# Altium footprint library hallglib.PcbLib: 106 footprints (part 2 of 7)
Each footprint in its own frame and in the unit in brackets; x right, y up, seen from the top. Pads: shape width x height; smd on the part's side, far side on the other; paste and mask are expansions set on the pad; w line width, h text height; cw(c..) or ccw(c..) is an arc to the next point about the centre after c.
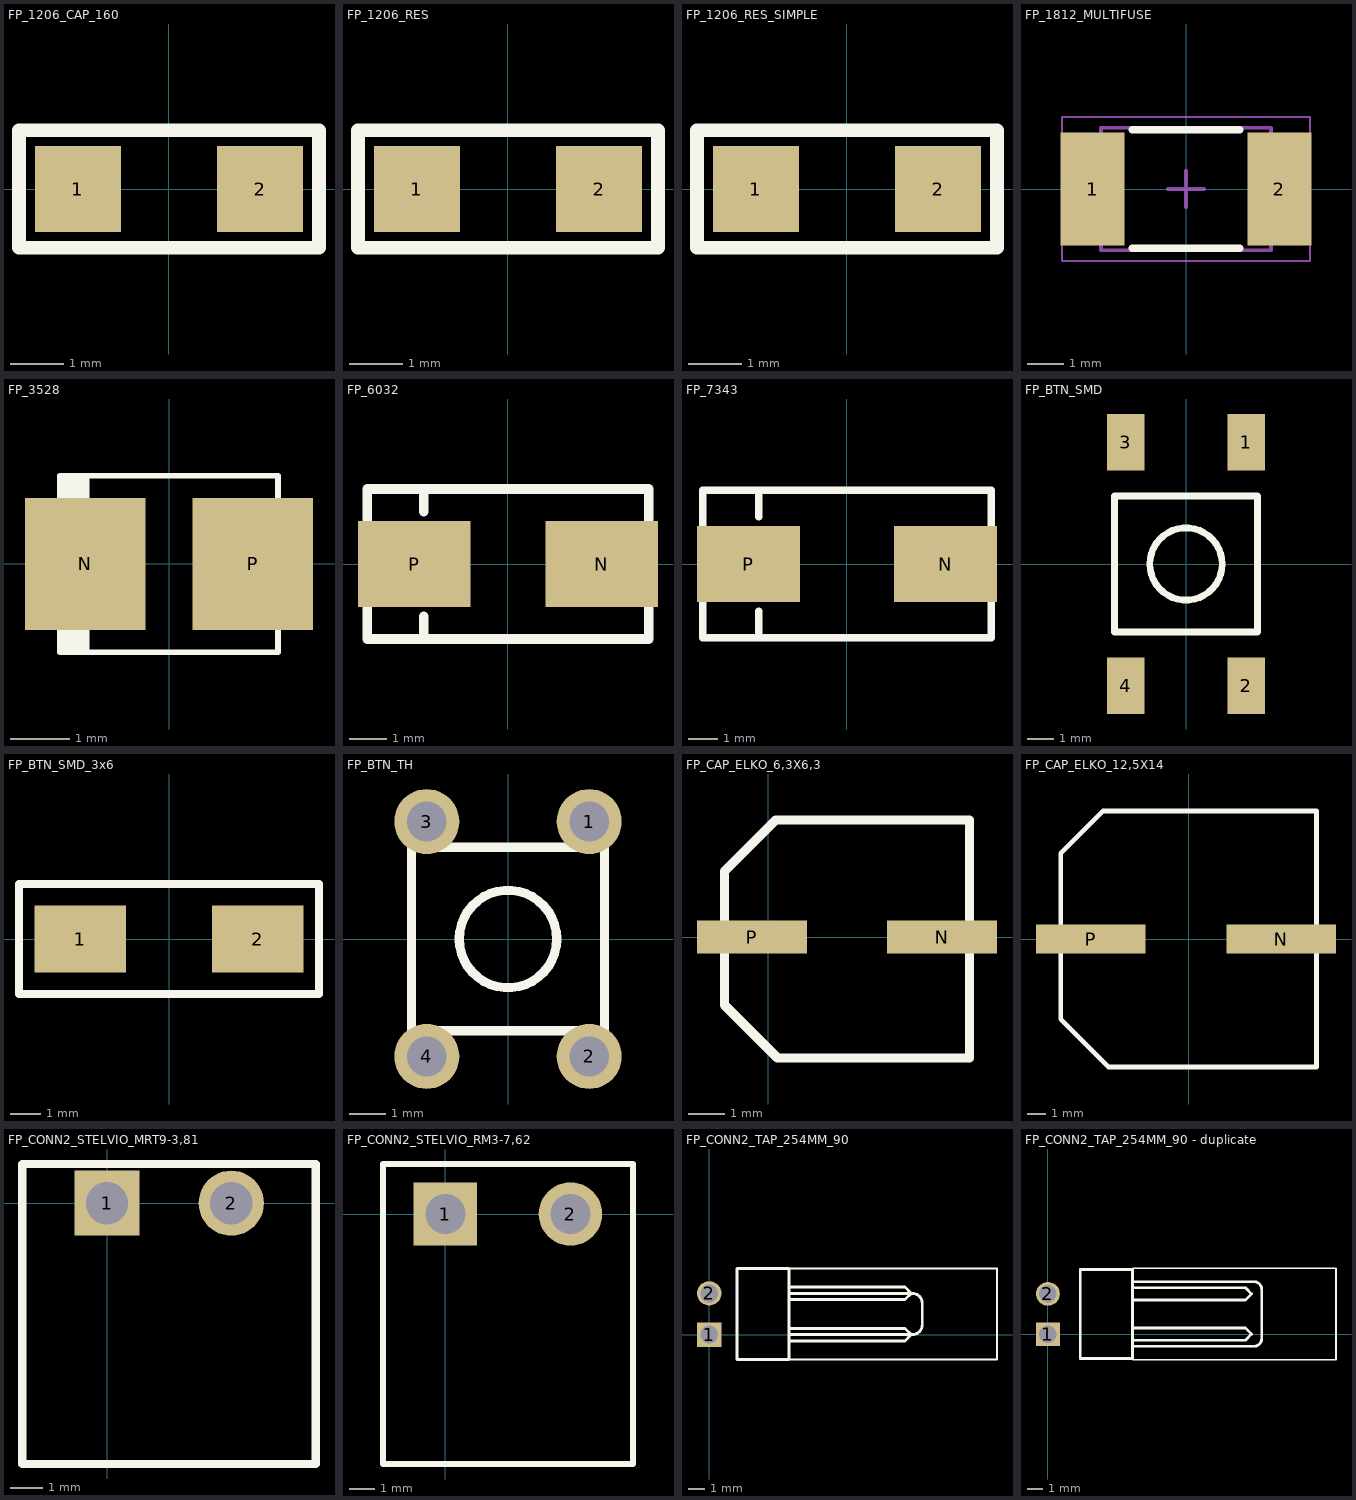
[diagram p1: the footprints below, top view; thin cyan lines are the x and y axes]

## FP_1206_CAP_160 [mm] "1206 kapacitás 1.6mm magas"
height 1.62
pads (2):
  rect 1.6x1.6 smd: 1(-1.7,0) 2(1.7,0)
Top Overlay:
  lines w0.254: -2.8,-1.1 2.8,-1.1 2.8,1.1 -2.8,1.1 -2.8,-1.1
3D body: height 1.6, standoff 0, extent -1.065,-0.787 1.119,0.787
3D body: height 1.6, standoff 0, extent 1.119,-0.787 1.577,0.787
3D body: height 1.6, standoff 0, extent -1.522,-0.787 -1.065,0.787

## FP_1206_RES [mm] "1206 ellenállás"
height 0.5
pads (2):
  rect 1.6x1.6 smd: 1(-1.7,0) 2(1.7,0)
Top Overlay:
  lines w0.254: -2.8,-1.1 -2.8,1.1 2.8,1.1 2.8,-1.1 -2.8,-1.1
3D body "1206RES.STEP": height 0.62, standoff 0.02, extent -1.6,-0.8 1.6,0.8

## FP_1206_RES_SIMPLE [mm] "1206 ellenállás, amit én csináltam"
height 0.5
pads (2):
  rect 1.6x1.6 smd: 1(-1.7,0) 2(1.7,0)
Top Overlay:
  lines w0.254: -2.8,-1.1 -2.8,1.1 2.8,1.1 2.8,-1.1 -2.8,-1.1
3D body: height 0.5, standoff 0, extent -1.522,-0.787 -1.065,0.787
3D body: height 0.5, standoff 0, extent 1.119,-0.787 1.577,0.787
3D body: height 0.5, standoff 0, extent -1.065,-0.787 1.119,0.787

## FP_1812_MULTIFUSE [mm]
height 1.25
pads (2):
  rect 1.78x3.15 smd: 1(-2.6,0) 2(2.6,0)
Top Overlay:
  lines w0.2: -1.5,-1.65 1.5,-1.65 ; -1.5,1.65 1.5,1.65
Mechanical 13:
  lines w0.1: -2.365,-1.705 -2.365,1.705 2.365,1.705 2.365,-1.705 -2.365,-1.705
Mechanical 15:
  lines w0.05: -3.45,-2 -3.45,2 3.45,2 3.45,-2 -3.45,-2
  lines w0.1: -0.5,0 0.5,0 ; 0,-0.5 0,0.5
3D body "FP_1812_MULTIFUSE.step": height 1.25, standoff 0, extent -2.365,-1.705 2.365,1.705

## FP_3528 [mm] "3528 TANTÁL SMD \"B\"-TOK"
height 1.9
pads (2):
  rect 2.05x2.25 smd: N(-1.425,0) P(1.425,0)
Top Overlay:
  rectangle: -1.85,-1.5 -1.352,1.5
  lines w0.1: -1.85,-1.5 -1.85,1.5 1.85,1.5 1.85,-1.5 -1.85,-1.5
3D body "CAP3528-B.STEP": height 2.11, standoff -0.04, extent -2.517,-1.499 2.482,1.499

## FP_6032 [mm]
pads (2):
  rect 3x2.3 smd: N(2.5,0) P(-2.5,0)
Top Overlay:
  lines w0.254: -2.25,-2 -2.25,-1.4 ; -2.25,1.4 -2.25,2 ; -3.75,-2 -3.75,2 3.75,2 3.75,-2 -3.75,-2
3D body "CAP6032-C.STEP": height 2.79, standoff -0.04, extent -3.763,-1.735 3.835,1.778

## FP_7343 [mm]
pads (2):
  rect 3.5x2.6 smd: N(3.35,0) P(-3.35,0)
Top Overlay:
  lines w0.254: -3,-2.5 -3,-1.6 ; -3,1.6 -3,2.5 ; -4.9,-2.5 -4.9,2.5 4.9,2.5 4.9,-2.5 -4.9,-2.5
3D body "CAP7343-D.STEP": height 3.1, standoff -0.04, extent -4.494,-2.305 4.502,2.305

## FP_BTN_SMD [mm] "SMD Push Button 6x6mm"
height 4
pads (4):
  rect 1.4x2.1 smd: 1(2.25,4.55) 2(2.25,-4.55) 3(-2.25,4.55) 4(-2.25,-4.55)
Top Overlay:
  circle w0.254: c0,0 r1.35
  lines w0.254: -2.667,-2.54 2.667,-2.54 2.667,2.54 -2.667,2.54 -2.667,-2.54
3D body "Push Button SMD.STEP": height 5.1, standoff -0.01, extent -3,-5 3,5

## FP_BTN_SMD_3x6 [mm] "TACT 3x 6 2P"
height 4.3
pads (2):
  rect 3x2.2 smd: 1(-2.9,0) 2(2.9,0)
Top Overlay:
  lines w0.254: -4.9,-1.8 4.9,-1.8 4.9,1.8 -4.9,1.8 -4.9,-1.8
3D body: height 3, standoff 0, extent -2.9,-1.6 2.9,1.6
3D body: height 3.5, standoff 3, extent -0.9,-0.5 0.9,0.5

## FP_BTN_TH [mm] "TH Push Button 6x6mm"
height 4
pads (4):
  round 1.8 hole 1.1: 1(2.248,3.251) 2(2.248,-3.251) 3(-2.248,3.251) 4(-2.248,-3.251)
Top Overlay:
  circle w0.254: c0,0 r1.35
  lines w0.254: -2.667,-2.54 2.667,-2.54 2.667,2.54 -2.667,2.54 -2.667,-2.54
3D body "Push Button SMD.STEP": height 5.1, standoff -0.01, extent -3,-5 3,5

## FP_CAP_ELKO_6,3X6,3 [mm] "680 uF/SMD-NIC 47 uF/SMD-NIC ELKO 16 V 105°C 20 % KIS IMPEDANCIÁS SMD O6,3x6,3mm"
height 6.3
pads (2):
  rect 3x0.9 smd: N(4.75,0) P(-0.45,0)
Top Overlay:
  lines w0.254: -1.2,-1.852 0.248,-3.3 5.5,-3.3 5.5,3.2 0.2,3.2 -1.2,1.8 -1.2,-1.852
3D body: height 6.3, standoff 0, extent -1.1,-3.137 5.175,3.15
3D body: height 0.3, standoff 0, extent -1.25,-3.3 5.35,3.3

## FP_CAP_ELKO_12,5X14 [mm] "680 uF/SMD-NIC ELKO 35 V 105°C 20 % KIS IMPEDANCIÁS SMD O12.5x14mm"
height 14
pads (2):
  rect 6x1.6 smd: N(5.066,0) P(-5.348,0)
Top Overlay:
  lines w0.254: -7,-4.4 -7,4.7 -4.7,7 7,7 7,-7 -4.4,-7 -7,-4.4
3D body: height 14, standoff 0, extent -6.226,-6.05 6.225,6.425
3D body: height 0.3, standoff 0, extent -7,-7 7,7

## FP_CONN2_STELVIO_MRT9-3,81 [mm] "STELVIO gyártmányú sorkapocs csatlakozó MRT9 fekvõ"
height 7.25
pads (2):
  rect 2x2 hole 1.3: 1(0,0)
  round 2 hole 1.3: 2(3.81,0)
Top Overlay:
  lines w0.254: -2.6,-8 -2.6,1.2 6.4,1.2 6.4,-8 -2.6,-8
3D body: height 0, standoff -3, extent 3.41,-0.4 4.21,0.4
3D body: height 0, standoff -3, extent -0.4,-0.4 0.4,0.4
3D body: height 7.25, standoff 6.75, extent -1.5,-8 5.4,-1.2
3D body: height 1, standoff 0, extent -1.5,-8 5.4,-1.2
3D body: height 7.25, standoff 0, extent 1.65,-8 2.15,-1.2
3D body: height 7.25, standoff 0, extent 5.4,-8 6.4,-1.2
3D body: height 7.25, standoff 0, extent -2.5,-1.2 6.4,1.2
3D body: height 7.25, standoff 0, extent -2.5,-8 -1.5,-1.2

## FP_CONN2_STELVIO_RM3-7,62 [mm] "STELVIO CPM 7,62/2-SQ"
height 8.3
pads (2):
  rect 2.54x2.54 hole 1.6: 1(0,0)
  round 2.54 hole 1.6: 2(5,0)
Top Overlay:
  lines w0.254: -2.5,-10 7.5,-10 7.5,2 -2.5,2 -2.5,-10
3D body: height 8.3, standoff 0, extent -2.5,-10 -2.1,-1.2
3D body: height 8.3, standoff 0, extent -2.5,-1.2 7.5,2
3D body: height 8.3, standoff 0, extent 7.1,-10 7.5,-1.2
3D body: height 1, standoff 0, extent -2.1,-10 7.1,-1.2
3D body: height 8.3, standoff 7.3, extent -2.1,-10 7.1,-1.2
3D body: height 0, standoff -3.5, extent -0.5,-0.5 0.5,0.5
3D body: height 0, standoff -3.5, extent 4.5,-0.5 5.5,0.5
3D body: height 4.3, standoff 3.3, extent -0.5,-9.5 0.5,-0.5
3D body: height 4.3, standoff 3.3, extent 4.5,-9.5 5.5,-0.5

## FP_CONN2_TAP_254MM_90 [mm] "fekvõ két pólusú tápcsatlakozó 2.54mm"
height 11.4
pads (2):
  rect 1.5x1.5 hole 1.1: 1(0,0)
  round 1.5 hole 1.1: 2(0,2.54)
Top Overlay:
  lines w0.102: 4.9,-1.53 17.7,-1.53 17.7,4.07 4.9,4.07
  lines w0.178: 4.9,0 12.5,0 ccw(c12.5,0.6) 13.1,0.6 13.1,1.94 ccw(c12.5,1.94) 12.5,2.54 4.9,2.54 ; 4.934,-0.381 12.046,-0.381 12.427,0 12.046,0.381 4.934,0.381 ; 4.934,2.159 12.046,2.159 12.427,2.54 12.046,2.921 4.934,2.921 ; 1.7,-1.524 1.7,4.07 4.9,4.07 4.9,-1.524 1.7,-1.524
3D body "254_TAP_2P.STEP": height 5.8, standoff -3.4, extent -0.325,-1.3 13.5,3.78

## FP_CONN2_TAP_254MM_90 - duplicate [mm] "fekvõ két pólusú tápcsatlakozó 2.54mm"
height 11.4
pads (2):
  rect 1.5x1.5 hole 1.1: 1(0,0)
  round 1.5 hole 1.1: 2(0,2.54)
Top Overlay:
  lines w0.102: 5.334,-1.6 18.136,-1.6 18.136,4.14 5.334,4.14
  lines w0.178: 5.334,-0.762 12.954,-0.762 ccw(c12.954,-0.254) 13.462,-0.254 13.462,2.794 ccw(c12.954,2.794) 12.954,3.302 5.334,3.302 ; 5.334,-0.381 12.446,-0.381 12.827,0 12.446,0.381 5.334,0.381 ; 5.334,2.159 12.446,2.159 12.827,2.54 12.446,2.921 5.334,2.921 ; 2.032,-1.524 5.334,-1.524 5.334,4.07 2.032,4.07 2.032,-1.524
3D body "254_TAP_2P.STEP": height 5.8, standoff -3.4, extent -0.325,-1.3 13.5,3.78